# Altium schematic symbol library jlcpcb_2025_04_inductors_extended_0805.schlib: 882 symbols (part 3 of 5) (continued)
## LQW2BAN27NG00L
designator L?  Inductance: 27nH
Inductor, 27nH, ±2%, 70mΩ, 2A, SMD 0805; Manufacturer: Murata Electronics; Manufacturer Part Number: LQW2BAN27NG00L; Self-Resonant Frequency: 2.75GHz; Q Factor: 85@500MHz; Package Size: 0805; JLCPCB Basic Part: No; JLCPCB Part Number: C1329793; Supplier 1: LCSC; Category: Inductors; Supplier Part Number 1: C1329793; Tolerance: ±2%; Rated Current: 2A; DC Resistance: 70mΩ; RoHS: Yes; ComponentLink1Description: Datasheet; ComponentLink1URL: https://wmsc.lcsc.com/wmsc/upload/file/pdf/v2/lcsc/2304140030_Murata-Electronics-LQW2BAN27NG00L_C1329793.pdf; ComponentLink2Description: JLCPCB Part URL; ComponentLink2URL: https://jlcpcb.com/partdetail/C1329793; ComponentLink3Description: LCSC Part URL; ComponentLink3URL: https://lcsc.com/product-detail/Inductors-SMD_Murata-Electronics-Murata-Electronics-LQW2BAN27NG00L_C1329793.html
footprint IND-0805 (0805 (2012M) Inductor)
pins: 1, 2

## LQW2BAN27NJ00L
designator L?  Inductance: 27nH
Inductor, 27nH, ±5%, 70mΩ, SMD 0805; Manufacturer: Murata Electronics; Manufacturer Part Number: LQW2BAN27NJ00L; Self-Resonant Frequency: 2.75GHz; Q Factor: 85@500MHz; Package Size: 0805; JLCPCB Basic Part: No; JLCPCB Part Number: C1330812; Supplier 1: LCSC; Category: Inductors; Supplier Part Number 1: C1330812; Tolerance: ±5%; DC Resistance: 70mΩ; RoHS: Yes; ComponentLink1Description: Datasheet; ComponentLink1URL: https://wmsc.lcsc.com/wmsc/upload/file/pdf/v2/lcsc/2304140030_Murata-Electronics-LQW2BAN27NJ00L_C1330812.pdf; ComponentLink2Description: JLCPCB Part URL; ComponentLink2URL: https://jlcpcb.com/partdetail/C1330812; ComponentLink3Description: LCSC Part URL; ComponentLink3URL: https://lcsc.com/product-detail/Inductors-SMD_Murata-Electronics-Murata-Electronics-LQW2BAN27NJ00L_C1330812.html
footprint IND-0805 (0805 (2012M) Inductor)
pins: 1, 2

## LQW2BAN33NG00L
designator L?  Inductance: 33nH
Inductor, 33nH, ±2%, 120mΩ, 1.5A, SMD 0805; Manufacturer: Murata Electronics; Manufacturer Part Number: LQW2BAN33NG00L; Self-Resonant Frequency: 1.9GHz; Q Factor: 75@500MHz; Package Size: 0805; JLCPCB Basic Part: No; JLCPCB Part Number: C1330869; Supplier 1: LCSC; Category: Inductors; Supplier Part Number 1: C1330869; Tolerance: ±2%; Rated Current: 1.5A; DC Resistance: 120mΩ; RoHS: Yes; ComponentLink1Description: Datasheet; ComponentLink1URL: https://wmsc.lcsc.com/wmsc/upload/file/pdf/v2/lcsc/2304140030_Murata-Electronics-LQW2BAN33NG00L_C1330869.pdf; ComponentLink2Description: JLCPCB Part URL; ComponentLink2URL: https://jlcpcb.com/partdetail/C1330869; ComponentLink3Description: LCSC Part URL; ComponentLink3URL: https://lcsc.com/product-detail/Inductors-SMD_Murata-Electronics-Murata-Electronics-LQW2BAN33NG00L_C1330869.html
footprint IND-0805 (0805 (2012M) Inductor)
pins: 1, 2

## LQW2BAN47NG00L
designator L?  Inductance: 47nH
Inductor, 47nH, ±2%, 200mΩ, 1.25A, SMD 0805; Manufacturer: Murata Electronics; Manufacturer Part Number: LQW2BAN47NG00L; Package Size: 0805; JLCPCB Basic Part: No; JLCPCB Part Number: C2047552; Supplier 1: LCSC; Category: Inductors; Supplier Part Number 1: C2047552; Tolerance: ±2%; Rated Current: 1.25A; DC Resistance: 200mΩ; RoHS: Yes; ComponentLink1Description: Datasheet; ComponentLink1URL: https://wmsc.lcsc.com/wmsc/upload/file/pdf/v2/lcsc/2202010330_Murata-Electronics-LQW2BAN47NG00L_C2047552.pdf; ComponentLink2Description: JLCPCB Part URL; ComponentLink2URL: https://jlcpcb.com/partdetail/C2047552; ComponentLink3Description: LCSC Part URL; ComponentLink3URL: https://lcsc.com/product-detail/Power-Inductors_Murata-Electronics-Murata-Electronics-LQW2BAN47NG00L_C2047552.html
footprint IND-0805 (0805 (2012M) Inductor)
pins: 1, 2

## LQW2BAN75NG00L
designator L?  Inductance: 75nH
Inductor, 75nH, ±2%, 280mΩ, 1.1A, SMD 0805; Manufacturer: Murata Electronics; Manufacturer Part Number: LQW2BAN75NG00L; Package Size: 0805; JLCPCB Basic Part: No; JLCPCB Part Number: C2044773; Supplier 1: LCSC; Category: Inductors; Supplier Part Number 1: C2044773; Tolerance: ±2%; Rated Current: 1.1A; DC Resistance: 280mΩ; RoHS: Yes; ComponentLink1Description: Datasheet; ComponentLink1URL: https://wmsc.lcsc.com/wmsc/upload/file/pdf/v2/lcsc/2304140030_Murata-Electronics-LQW2BAN75NG00L_C2044773.pdf; ComponentLink2Description: JLCPCB Part URL; ComponentLink2URL: https://jlcpcb.com/partdetail/C2044773; ComponentLink3Description: LCSC Part URL; ComponentLink3URL: https://lcsc.com/product-detail/Power-Inductors_Murata-Electronics-Murata-Electronics-LQW2BAN75NG00L_C2044773.html
footprint IND-0805 (0805 (2012M) Inductor)
pins: 1, 2

## LQW2BAN91NG00L
designator L?  Inductance: 91nH
Inductor, 91nH, ±2%, 210mΩ, 1.3A, SMD 0805; Manufacturer: Murata Electronics; Manufacturer Part Number: LQW2BAN91NG00L; Package Size: 0805; JLCPCB Basic Part: No; JLCPCB Part Number: C2046328; Supplier 1: LCSC; Category: Inductors; Supplier Part Number 1: C2046328; Tolerance: ±2%; Rated Current: 1.3A; DC Resistance: 210mΩ; RoHS: Yes; ComponentLink1Description: Datasheet; ComponentLink1URL: https://wmsc.lcsc.com/wmsc/upload/file/pdf/v2/lcsc/2304140030_Murata-Electronics-LQW2BAN91NG00L_C2046328.pdf; ComponentLink2Description: JLCPCB Part URL; ComponentLink2URL: https://jlcpcb.com/partdetail/C2046328; ComponentLink3Description: LCSC Part URL; ComponentLink3URL: https://lcsc.com/product-detail/Power-Inductors_Murata-Electronics-Murata-Electronics-LQW2BAN91NG00L_C2046328.html
footprint IND-0805 (0805 (2012M) Inductor)
pins: 1, 2

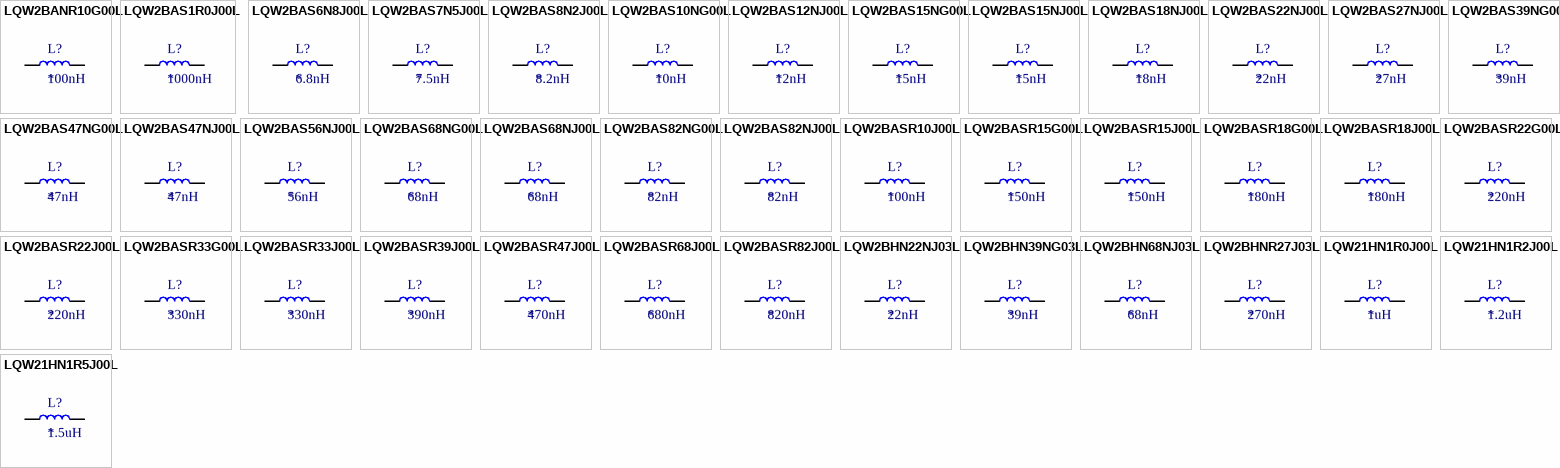
[diagram p12: symbols LQW2BANR10G00L to LQW21HN1R5J00L]

## LQW2BANR10G00L
designator L?  Inductance: 100nH
Inductor, 100nH, ±2%, 350mΩ, 1.05A, SMD 0805; Manufacturer: Murata Electronics; Manufacturer Part Number: LQW2BANR10G00L; Self-Resonant Frequency: 1.2GHz; Q Factor: 66@500MHz; Package Size: 0805; JLCPCB Basic Part: No; JLCPCB Part Number: C1330863; Supplier 1: LCSC; Category: Inductors; Supplier Part Number 1: C1330863; Tolerance: ±2%; Rated Current: 1.05A; DC Resistance: 350mΩ; RoHS: Yes; ComponentLink1Description: Datasheet; ComponentLink1URL: https://wmsc.lcsc.com/wmsc/upload/file/pdf/v2/lcsc/2304140030_Murata-Electronics-LQW2BANR10G00L_C1330863.pdf; ComponentLink2Description: JLCPCB Part URL; ComponentLink2URL: https://jlcpcb.com/partdetail/C1330863; ComponentLink3Description: LCSC Part URL; ComponentLink3URL: https://lcsc.com/product-detail/Inductors-SMD_Murata-Electronics-Murata-Electronics-LQW2BANR10G00L_C1330863.html
footprint IND-0805 (0805 (2012M) Inductor)
pins: 1, 2

## LQW2BAS1R0J00L
designator L?  Inductance: 1000nH
Inductor, 1000nH, ±5%, 2.4Ω, 170mA, SMD 0805; Manufacturer: Murata Electronics; Manufacturer Part Number: LQW2BAS1R0J00L; Self-Resonant Frequency: 200MHz; Q Factor: 23@50MHz; Package Size: 0805; JLCPCB Basic Part: No; JLCPCB Part Number: C333860; Supplier 1: LCSC; Category: Inductors; Supplier Part Number 1: C333860; Tolerance: ±5%; Rated Current: 170mA; DC Resistance: 2.4Ω; RoHS: Yes; ComponentLink1Description: Datasheet; ComponentLink1URL: https://wmsc.lcsc.com/wmsc/upload/file/pdf/v2/lcsc/2304140030_Murata-Electronics-LQW2BAS1R0J00L_C333860.pdf; ComponentLink2Description: JLCPCB Part URL; ComponentLink2URL: https://jlcpcb.com/partdetail/C333860; ComponentLink3Description: LCSC Part URL; ComponentLink3URL: https://lcsc.com/product-detail/Inductors-SMD_Murata-Electronics-Murata-Electronics-LQW2BAS1R0J00L_C333860.html
footprint IND-0805 (0805 (2012M) Inductor)
pins: 1, 2

## LQW2BAS6N8J00L
designator L?  Inductance: 6.8nH
Inductor, 6.8nH, ±5%, 110mΩ, 600mA, SMD 0805; Manufacturer: Murata Electronics; Manufacturer Part Number: LQW2BAS6N8J00L; Package Size: 0805; JLCPCB Basic Part: No; JLCPCB Part Number: C701176; Supplier 1: LCSC; Category: Inductors; Supplier Part Number 1: C701176; Tolerance: ±5%; Rated Current: 600mA; DC Resistance: 110mΩ; RoHS: Yes; ComponentLink1Description: Datasheet; ComponentLink1URL: https://wmsc.lcsc.com/wmsc/upload/file/pdf/v2/lcsc/2009241508_Murata-Electronics-LQW2BAS6N8J00L_C701176.pdf; ComponentLink2Description: JLCPCB Part URL; ComponentLink2URL: https://jlcpcb.com/partdetail/C701176; ComponentLink3Description: LCSC Part URL; ComponentLink3URL: https://lcsc.com/product-detail/Power-Inductors_Murata-Electronics-Murata-Electronics-LQW2BAS6N8J00L_C701176.html
footprint IND-0805 (0805 (2012M) Inductor)
pins: 1, 2

## LQW2BAS7N5J00L
designator L?  Inductance: 7.5nH
Inductor, 7.5nH, ±5%, 140mΩ, SMD 0805; Manufacturer: Murata Electronics; Manufacturer Part Number: LQW2BAS7N5J00L; Self-Resonant Frequency: 4.8GHz; Q Factor: 50@1000MHz; Package Size: 0805; JLCPCB Basic Part: No; JLCPCB Part Number: C162658; Supplier 1: LCSC; Category: Inductors; Supplier Part Number 1: C162658; Tolerance: ±5%; DC Resistance: 140mΩ; RoHS: Yes; ComponentLink1Description: Datasheet; ComponentLink1URL: https://wmsc.lcsc.com/wmsc/upload/file/pdf/v2/lcsc/2304140030_Murata-Electronics-LQW2BAS7N5J00L_C162658.pdf; ComponentLink2Description: JLCPCB Part URL; ComponentLink2URL: https://jlcpcb.com/partdetail/C162658; ComponentLink3Description: LCSC Part URL; ComponentLink3URL: https://lcsc.com/product-detail/Inductors-SMD_Murata-Electronics-Murata-Electronics-LQW2BAS7N5J00L_C162658.html
footprint IND-0805 (0805 (2012M) Inductor)
pins: 1, 2

## LQW2BAS8N2J00L
designator L?  Inductance: 8.2nH
Inductor, 8.2nH, ±5%, 120mΩ, SMD 0805; Manufacturer: Murata Electronics; Manufacturer Part Number: LQW2BAS8N2J00L; Self-Resonant Frequency: 4.4GHz; Q Factor: 50@1000MHz; Package Size: 0805; JLCPCB Basic Part: No; JLCPCB Part Number: C341801; Supplier 1: LCSC; Category: Inductors; Supplier Part Number 1: C341801; Tolerance: ±5%; DC Resistance: 120mΩ; RoHS: Yes; ComponentLink1Description: Datasheet; ComponentLink1URL: https://wmsc.lcsc.com/wmsc/upload/file/pdf/v2/lcsc/2304140030_Murata-Electronics-LQW2BAS8N2J00L_C341801.pdf; ComponentLink2Description: JLCPCB Part URL; ComponentLink2URL: https://jlcpcb.com/partdetail/C341801; ComponentLink3Description: LCSC Part URL; ComponentLink3URL: https://lcsc.com/product-detail/Inductors-SMD_Murata-Electronics-Murata-Electronics-LQW2BAS8N2J00L_C341801.html
footprint IND-0805 (0805 (2012M) Inductor)
pins: 1, 2

## LQW2BAS10NG00L
designator L?  Inductance: 10nH
Inductor, 10nH, ±2%, 100mΩ, 600mA, SMD 0805; Manufacturer: Murata Electronics; Manufacturer Part Number: LQW2BAS10NG00L; Self-Resonant Frequency: 4.3GHz; Q Factor: 60@500MHz; Package Size: 0805; JLCPCB Basic Part: No; JLCPCB Part Number: C341792; Supplier 1: LCSC; Category: Inductors; Supplier Part Number 1: C341792; Tolerance: ±2%; Rated Current: 600mA; DC Resistance: 100mΩ; RoHS: Yes; ComponentLink1Description: Datasheet; ComponentLink1URL: https://wmsc.lcsc.com/wmsc/upload/file/pdf/v2/lcsc/2304140030_Murata-Electronics-LQW2BAS10NG00L_C341792.pdf; ComponentLink2Description: JLCPCB Part URL; ComponentLink2URL: https://jlcpcb.com/partdetail/C341792; ComponentLink3Description: LCSC Part URL; ComponentLink3URL: https://lcsc.com/product-detail/Inductors-SMD_Murata-Electronics-Murata-Electronics-LQW2BAS10NG00L_C341792.html
footprint IND-0805 (0805 (2012M) Inductor)
pins: 1, 2

## LQW2BAS12NJ00L
designator L?  Inductance: 12nH
Inductor, 12nH, ±5%, 150mΩ, SMD 0805; Manufacturer: Murata Electronics; Manufacturer Part Number: LQW2BAS12NJ00L; Self-Resonant Frequency: 4GHz; Q Factor: 50@500MHz; Package Size: 0805; JLCPCB Basic Part: No; JLCPCB Part Number: C341793; Supplier 1: LCSC; Category: Inductors; Supplier Part Number 1: C341793; Tolerance: ±5%; DC Resistance: 150mΩ; RoHS: Yes; ComponentLink1Description: Datasheet; ComponentLink1URL: https://wmsc.lcsc.com/wmsc/upload/file/pdf/v2/lcsc/2304140030_Murata-Electronics-LQW2BAS12NJ00L_C341793.pdf; ComponentLink2Description: JLCPCB Part URL; ComponentLink2URL: https://jlcpcb.com/partdetail/C341793; ComponentLink3Description: LCSC Part URL; ComponentLink3URL: https://lcsc.com/product-detail/Inductors-SMD_Murata-Electronics-Murata-Electronics-LQW2BAS12NJ00L_C341793.html
footprint IND-0805 (0805 (2012M) Inductor)
pins: 1, 2

## LQW2BAS15NG00L
designator L?  Inductance: 15nH
Inductor, 15nH, ±2%, 170mΩ, 600mA, SMD 0805; Manufacturer: Murata Electronics; Manufacturer Part Number: LQW2BAS15NG00L; Self-Resonant Frequency: 3.2GHz; Q Factor: 50@500MHz; Package Size: 0805; JLCPCB Basic Part: No; JLCPCB Part Number: C341794; Supplier 1: LCSC; Category: Inductors; Supplier Part Number 1: C341794; Tolerance: ±2%; Rated Current: 600mA; DC Resistance: 170mΩ; RoHS: Yes; ComponentLink1Description: Datasheet; ComponentLink1URL: https://wmsc.lcsc.com/wmsc/upload/file/pdf/v2/lcsc/2304140030_Murata-Electronics-LQW2BAS15NG00L_C341794.pdf; ComponentLink2Description: JLCPCB Part URL; ComponentLink2URL: https://jlcpcb.com/partdetail/C341794; ComponentLink3Description: LCSC Part URL; ComponentLink3URL: https://lcsc.com/product-detail/Inductors-SMD_Murata-Electronics-Murata-Electronics-LQW2BAS15NG00L_C341794.html
footprint IND-0805 (0805 (2012M) Inductor)
pins: 1, 2

## LQW2BAS15NJ00L
designator L?  Inductance: 15nH
Inductor, 15nH, ±5%, 170mΩ, 600mA, SMD 0805; Manufacturer: Murata Electronics; Manufacturer Part Number: LQW2BAS15NJ00L; Package Size: 0805; JLCPCB Basic Part: No; JLCPCB Part Number: C440247; Supplier 1: LCSC; Category: Inductors; Supplier Part Number 1: C440247; Tolerance: ±5%; Rated Current: 600mA; DC Resistance: 170mΩ; RoHS: Yes; ComponentLink1Description: Datasheet; ComponentLink1URL: https://wmsc.lcsc.com/wmsc/upload/file/pdf/v2/lcsc/2304140030_Murata-Electronics-LQW2BAS15NJ00L_C440247.pdf; ComponentLink2Description: JLCPCB Part URL; ComponentLink2URL: https://jlcpcb.com/partdetail/C440247; ComponentLink3Description: LCSC Part URL; ComponentLink3URL: https://lcsc.com/product-detail/Power-Inductors_Murata-Electronics-Murata-Electronics-LQW2BAS15NJ00L_C440247.html
footprint IND-0805 (0805 (2012M) Inductor)
pins: 1, 2

## LQW2BAS18NJ00L
designator L?  Inductance: 18nH
Inductor, 18nH, ±5%, 200mΩ, SMD 0805; Manufacturer: Murata Electronics; Manufacturer Part Number: LQW2BAS18NJ00L; Self-Resonant Frequency: 3.1GHz; Q Factor: 50@500MHz; Package Size: 0805; JLCPCB Basic Part: No; JLCPCB Part Number: C341795; Supplier 1: LCSC; Category: Inductors; Supplier Part Number 1: C341795; Tolerance: ±5%; DC Resistance: 200mΩ; RoHS: Yes; ComponentLink1Description: Datasheet; ComponentLink1URL: https://wmsc.lcsc.com/wmsc/upload/file/pdf/v2/lcsc/2304140030_Murata-Electronics-LQW2BAS18NJ00L_C341795.pdf; ComponentLink2Description: JLCPCB Part URL; ComponentLink2URL: https://jlcpcb.com/partdetail/C341795; ComponentLink3Description: LCSC Part URL; ComponentLink3URL: https://lcsc.com/product-detail/Inductors-SMD_Murata-Electronics-Murata-Electronics-LQW2BAS18NJ00L_C341795.html
footprint IND-0805 (0805 (2012M) Inductor)
pins: 1, 2

## LQW2BAS22NJ00L
designator L?  Inductance: 22nH
Inductor, 22nH, ±5%, 220mΩ, 500mA, SMD 0805; Manufacturer: Murata Electronics; Manufacturer Part Number: LQW2BAS22NJ00L; Package Size: 0805; JLCPCB Basic Part: No; JLCPCB Part Number: C668481; Supplier 1: LCSC; Category: Inductors; Supplier Part Number 1: C668481; Tolerance: ±5%; Rated Current: 500mA; DC Resistance: 220mΩ; RoHS: Yes; ComponentLink1Description: Datasheet; ComponentLink1URL: https://wmsc.lcsc.com/wmsc/upload/file/pdf/v2/lcsc/2009241508_Murata-Electronics-LQW2BAS22NJ00L_C668481.pdf; ComponentLink2Description: JLCPCB Part URL; ComponentLink2URL: https://jlcpcb.com/partdetail/C668481; ComponentLink3Description: LCSC Part URL; ComponentLink3URL: https://lcsc.com/product-detail/Power-Inductors_Murata-Electronics-Murata-Electronics-LQW2BAS22NJ00L_C668481.html
footprint IND-0805 (0805 (2012M) Inductor)
pins: 1, 2

## LQW2BAS27NJ00L
designator L?  Inductance: 27nH
Inductor, 27nH, ±5%, 250mΩ, 500mA, SMD 0805; Manufacturer: Murata Electronics; Manufacturer Part Number: LQW2BAS27NJ00L; Self-Resonant Frequency: 2.58GHz; Q Factor: 55@500MHz; Package Size: 0805; JLCPCB Basic Part: No; JLCPCB Part Number: C162656; Supplier 1: LCSC; Category: Inductors; Supplier Part Number 1: C162656; Tolerance: ±5%; Rated Current: 500mA; DC Resistance: 250mΩ; RoHS: Yes; ComponentLink1Description: Datasheet; ComponentLink1URL: https://wmsc.lcsc.com/wmsc/upload/file/pdf/v2/lcsc/2304140030_Murata-Electronics-LQW2BAS27NJ00L_C162656.pdf; ComponentLink2Description: JLCPCB Part URL; ComponentLink2URL: https://jlcpcb.com/partdetail/C162656; ComponentLink3Description: LCSC Part URL; ComponentLink3URL: https://lcsc.com/product-detail/Inductors-SMD_Murata-Electronics-Murata-Electronics-LQW2BAS27NJ00L_C162656.html
footprint IND-0805 (0805 (2012M) Inductor)
pins: 1, 2

## LQW2BAS39NG00L
designator L?  Inductance: 39nH
Inductor, 39nH, ±2%, 290mΩ, 500mA, SMD 0805; Manufacturer: Murata Electronics; Manufacturer Part Number: LQW2BAS39NG00L; Self-Resonant Frequency: 2GHz; Q Factor: 60@500MHz; Package Size: 0805; JLCPCB Basic Part: No; JLCPCB Part Number: C341797; Supplier 1: LCSC; Category: Inductors; Supplier Part Number 1: C341797; Tolerance: ±2%; Rated Current: 500mA; DC Resistance: 290mΩ; RoHS: Yes; ComponentLink1Description: Datasheet; ComponentLink1URL: https://wmsc.lcsc.com/wmsc/upload/file/pdf/v2/lcsc/2304140030_Murata-Electronics-LQW2BAS39NG00L_C341797.pdf; ComponentLink2Description: JLCPCB Part URL; ComponentLink2URL: https://jlcpcb.com/partdetail/C341797; ComponentLink3Description: LCSC Part URL; ComponentLink3URL: https://lcsc.com/product-detail/Inductors-SMD_Murata-Electronics-Murata-Electronics-LQW2BAS39NG00L_C341797.html
footprint IND-0805 (0805 (2012M) Inductor)
pins: 1, 2

## LQW2BAS47NG00L
designator L?  Inductance: 47nH
Inductor, 47nH, ±2%, 310mΩ, 500mA, SMD 0805; Manufacturer: Murata Electronics; Manufacturer Part Number: LQW2BAS47NG00L; Self-Resonant Frequency: 1.7GHz; Q Factor: 60@500MHz; Package Size: 0805; JLCPCB Basic Part: No; JLCPCB Part Number: C162657; Supplier 1: LCSC; Category: Inductors; Supplier Part Number 1: C162657; Tolerance: ±2%; Rated Current: 500mA; DC Resistance: 310mΩ; RoHS: Yes; ComponentLink1Description: Datasheet; ComponentLink1URL: https://wmsc.lcsc.com/wmsc/upload/file/pdf/v2/lcsc/2304140030_Murata-Electronics-LQW2BAS47NG00L_C162657.pdf; ComponentLink2Description: JLCPCB Part URL; ComponentLink2URL: https://jlcpcb.com/partdetail/C162657; ComponentLink3Description: LCSC Part URL; ComponentLink3URL: https://lcsc.com/product-detail/Inductors-SMD_Murata-Electronics-Murata-Electronics-LQW2BAS47NG00L_C162657.html
footprint IND-0805 (0805 (2012M) Inductor)
pins: 1, 2

## LQW2BAS47NJ00L
designator L?  Inductance: 47nH
Inductor, 47nH, ±5%, 310mΩ, 500mA, SMD 0805; Manufacturer: Murata Electronics; Manufacturer Part Number: LQW2BAS47NJ00L; Package Size: 0805; JLCPCB Basic Part: No; JLCPCB Part Number: C440248; Supplier 1: LCSC; Category: Inductors; Supplier Part Number 1: C440248; Tolerance: ±5%; Rated Current: 500mA; DC Resistance: 310mΩ; RoHS: Yes; ComponentLink1Description: Datasheet; ComponentLink1URL: https://wmsc.lcsc.com/wmsc/upload/file/pdf/v2/lcsc/2304140030_Murata-Electronics-LQW2BAS47NJ00L_C440248.pdf; ComponentLink2Description: JLCPCB Part URL; ComponentLink2URL: https://jlcpcb.com/partdetail/C440248; ComponentLink3Description: LCSC Part URL; ComponentLink3URL: https://lcsc.com/product-detail/Power-Inductors_Murata-Electronics-Murata-Electronics-LQW2BAS47NJ00L_C440248.html
footprint IND-0805 (0805 (2012M) Inductor)
pins: 1, 2

## LQW2BAS56NJ00L
designator L?  Inductance: 56nH
Inductor, 56nH, ±5%, 340mΩ, 500mA, SMD 0805; Manufacturer: Murata Electronics; Manufacturer Part Number: LQW2BAS56NJ00L; Self-Resonant Frequency: 1.6GHz; Q Factor: 60@500MHz; Package Size: 0805; JLCPCB Basic Part: No; JLCPCB Part Number: C341799; Supplier 1: LCSC; Category: Inductors; Supplier Part Number 1: C341799; Tolerance: ±5%; Rated Current: 500mA; DC Resistance: 340mΩ; RoHS: Yes; ComponentLink1Description: Datasheet; ComponentLink1URL: https://wmsc.lcsc.com/wmsc/upload/file/pdf/v2/lcsc/2304140030_Murata-Electronics-LQW2BAS56NJ00L_C341799.pdf; ComponentLink2Description: JLCPCB Part URL; ComponentLink2URL: https://jlcpcb.com/partdetail/C341799; ComponentLink3Description: LCSC Part URL; ComponentLink3URL: https://lcsc.com/product-detail/Inductors-SMD_Murata-Electronics-Murata-Electronics-LQW2BAS56NJ00L_C341799.html
footprint IND-0805 (0805 (2012M) Inductor)
pins: 1, 2

## LQW2BAS68NG00L
designator L?  Inductance: 68nH
Inductor, 68nH, ±2%, 380mΩ, 500mA, SMD 0805; Manufacturer: Murata Electronics; Manufacturer Part Number: LQW2BAS68NG00L; Package Size: 0805; JLCPCB Basic Part: No; JLCPCB Part Number: C2044183; Supplier 1: LCSC; Category: Inductors; Supplier Part Number 1: C2044183; Tolerance: ±2%; Rated Current: 500mA; DC Resistance: 380mΩ; RoHS: Yes; ComponentLink1Description: Datasheet; ComponentLink1URL: https://wmsc.lcsc.com/wmsc/upload/file/pdf/v2/lcsc/2202010130_Murata-Electronics-LQW2BAS68NG00L_C2044183.pdf; ComponentLink2Description: JLCPCB Part URL; ComponentLink2URL: https://jlcpcb.com/partdetail/C2044183; ComponentLink3Description: LCSC Part URL; ComponentLink3URL: https://lcsc.com/product-detail/Power-Inductors_Murata-Electronics-Murata-Electronics-LQW2BAS68NG00L_C2044183.html
footprint IND-0805 (0805 (2012M) Inductor)
pins: 1, 2

## LQW2BAS68NJ00L
designator L?  Inductance: 68nH
Inductor, 68nH, ±5%, 380mΩ, 500mA, SMD 0805; Manufacturer: Murata Electronics; Manufacturer Part Number: LQW2BAS68NJ00L; Self-Resonant Frequency: 1.5GHz; Q Factor: 60@500MHz; Package Size: 0805; JLCPCB Basic Part: No; JLCPCB Part Number: C341800; Supplier 1: LCSC; Category: Inductors; Supplier Part Number 1: C341800; Tolerance: ±5%; Rated Current: 500mA; DC Resistance: 380mΩ; RoHS: Yes; ComponentLink1Description: Datasheet; ComponentLink1URL: https://wmsc.lcsc.com/wmsc/upload/file/pdf/v2/lcsc/2304140030_Murata-Electronics-LQW2BAS68NJ00L_C341800.pdf; ComponentLink2Description: JLCPCB Part URL; ComponentLink2URL: https://jlcpcb.com/partdetail/C341800; ComponentLink3Description: LCSC Part URL; ComponentLink3URL: https://lcsc.com/product-detail/Inductors-SMD_Murata-Electronics-Murata-Electronics-LQW2BAS68NJ00L_C341800.html
footprint IND-0805 (0805 (2012M) Inductor)
pins: 1, 2

## LQW2BAS82NG00L
designator L?  Inductance: 82nH
Inductor, 82nH, ±2%, 420mΩ, 400mA, SMD 0805; Manufacturer: Murata Electronics; Manufacturer Part Number: LQW2BAS82NG00L; Package Size: 0805; JLCPCB Basic Part: No; JLCPCB Part Number: C703723; Supplier 1: LCSC; Category: Inductors; Supplier Part Number 1: C703723; Tolerance: ±2%; Rated Current: 400mA; DC Resistance: 420mΩ; RoHS: Yes; ComponentLink1Description: Datasheet; ComponentLink1URL: https://wmsc.lcsc.com/wmsc/upload/file/pdf/v2/lcsc/2212191030_Murata-Electronics-LQW2BAS82NG00L_C703723.pdf; ComponentLink2Description: JLCPCB Part URL; ComponentLink2URL: https://jlcpcb.com/partdetail/C703723; ComponentLink3Description: LCSC Part URL; ComponentLink3URL: https://lcsc.com/product-detail/Power-Inductors_Murata-Electronics-Murata-Electronics-LQW2BAS82NG00L_C703723.html
footprint IND-0805 (0805 (2012M) Inductor)
pins: 1, 2

## LQW2BAS82NJ00L
designator L?  Inductance: 82nH
Inductor, 82nH, ±5%, 420mΩ, 400mA, SMD 0805; Manufacturer: Murata Electronics; Manufacturer Part Number: LQW2BAS82NJ00L; Self-Resonant Frequency: 1.33GHz; Q Factor: 65@500MHz; Package Size: 0805; JLCPCB Basic Part: No; JLCPCB Part Number: C162659; Supplier 1: LCSC; Category: Inductors; Supplier Part Number 1: C162659; Tolerance: ±5%; Rated Current: 400mA; DC Resistance: 420mΩ; RoHS: Yes; ComponentLink1Description: Datasheet; ComponentLink1URL: https://wmsc.lcsc.com/wmsc/upload/file/pdf/v2/lcsc/2304140030_Murata-Electronics-LQW2BAS82NJ00L_C162659.pdf; ComponentLink2Description: JLCPCB Part URL; ComponentLink2URL: https://jlcpcb.com/partdetail/C162659; ComponentLink3Description: LCSC Part URL; ComponentLink3URL: https://lcsc.com/product-detail/Inductors-SMD_Murata-Electronics-Murata-Electronics-LQW2BAS82NJ00L_C162659.html
footprint IND-0805 (0805 (2012M) Inductor)
pins: 1, 2

## LQW2BASR10J00L
designator L?  Inductance: 100nH
Inductor, 100nH, ±5%, 460mΩ, SMD 0805; Manufacturer: Murata Electronics; Manufacturer Part Number: LQW2BASR10J00L; Self-Resonant Frequency: 1.25GHz; Q Factor: 65@500MHz; Package Size: 0805; JLCPCB Basic Part: No; JLCPCB Part Number: C341802; Supplier 1: LCSC; Category: Inductors; Supplier Part Number 1: C341802; Tolerance: ±5%; DC Resistance: 460mΩ; RoHS: Yes; ComponentLink1Description: Datasheet; ComponentLink1URL: https://wmsc.lcsc.com/wmsc/upload/file/pdf/v2/lcsc/2304140030_Murata-Electronics-LQW2BASR10J00L_C341802.pdf; ComponentLink2Description: JLCPCB Part URL; ComponentLink2URL: https://jlcpcb.com/partdetail/C341802; ComponentLink3Description: LCSC Part URL; ComponentLink3URL: https://lcsc.com/product-detail/Inductors-SMD_Murata-Electronics-Murata-Electronics-LQW2BASR10J00L_C341802.html
footprint IND-0805 (0805 (2012M) Inductor)
pins: 1, 2

## LQW2BASR15G00L
designator L?  Inductance: 150nH
Inductor, 150nH, ±2%, 560mΩ, 400mA, SMD 0805; Manufacturer: Murata Electronics; Manufacturer Part Number: LQW2BASR15G00L; Package Size: 0805; JLCPCB Basic Part: No; JLCPCB Part Number: C703721; Supplier 1: LCSC; Category: Inductors; Supplier Part Number 1: C703721; Tolerance: ±2%; Rated Current: 400mA; DC Resistance: 560mΩ; RoHS: Yes; ComponentLink1Description: Datasheet; ComponentLink1URL: https://wmsc.lcsc.com/wmsc/upload/file/pdf/v2/lcsc/2105241334_Murata-Electronics-LQW2BASR15G00L_C703721.pdf; ComponentLink2Description: JLCPCB Part URL; ComponentLink2URL: https://jlcpcb.com/partdetail/C703721; ComponentLink3Description: LCSC Part URL; ComponentLink3URL: https://lcsc.com/product-detail/Power-Inductors_Murata-Electronics-Murata-Electronics-LQW2BASR15G00L_C703721.html
footprint IND-0805 (0805 (2012M) Inductor)
pins: 1, 2

## LQW2BASR15J00L
designator L?  Inductance: 150nH
Inductor, 150nH, ±5%, 560mΩ, SMD 0805; Manufacturer: Murata Electronics; Manufacturer Part Number: LQW2BASR15J00L; Self-Resonant Frequency: 920MHz; Q Factor: 50@250MHz; Package Size: 0805; JLCPCB Basic Part: No; JLCPCB Part Number: C341803; Supplier 1: LCSC; Category: Inductors; Supplier Part Number 1: C341803; Tolerance: ±5%; DC Resistance: 560mΩ; RoHS: Yes; ComponentLink1Description: Datasheet; ComponentLink1URL: https://wmsc.lcsc.com/wmsc/upload/file/pdf/v2/lcsc/2304140030_Murata-Electronics-LQW2BASR15J00L_C341803.pdf; ComponentLink2Description: JLCPCB Part URL; ComponentLink2URL: https://jlcpcb.com/partdetail/C341803; ComponentLink3Description: LCSC Part URL; ComponentLink3URL: https://lcsc.com/product-detail/Inductors-SMD_Murata-Electronics-Murata-Electronics-LQW2BASR15J00L_C341803.html
footprint IND-0805 (0805 (2012M) Inductor)
pins: 1, 2

## LQW2BASR18G00L
designator L?  Inductance: 180nH
Inductor, 180nH, ±2%, 640mΩ, 400mA, SMD 0805; Manufacturer: Murata Electronics; Manufacturer Part Number: LQW2BASR18G00L; Package Size: 0805; JLCPCB Basic Part: No; JLCPCB Part Number: C703720; Supplier 1: LCSC; Category: Inductors; Supplier Part Number 1: C703720; Tolerance: ±2%; Rated Current: 400mA; DC Resistance: 640mΩ; RoHS: Yes; ComponentLink1Description: Datasheet; ComponentLink1URL: https://wmsc.lcsc.com/wmsc/upload/file/pdf/v2/lcsc/2304140030_Murata-Electronics-LQW2BASR18G00L_C703720.pdf; ComponentLink2Description: JLCPCB Part URL; ComponentLink2URL: https://jlcpcb.com/partdetail/C703720; ComponentLink3Description: LCSC Part URL; ComponentLink3URL: https://lcsc.com/product-detail/Power-Inductors_Murata-Electronics-Murata-Electronics-LQW2BASR18G00L_C703720.html
footprint IND-0805 (0805 (2012M) Inductor)
pins: 1, 2

## LQW2BASR18J00L
designator L?  Inductance: 180nH
Inductor, 180nH, ±5%, 640mΩ, SMD 0805; Manufacturer: Murata Electronics; Manufacturer Part Number: LQW2BASR18J00L; Self-Resonant Frequency: 920MHz; Q Factor: 50@250MHz; Package Size: 0805; JLCPCB Basic Part: No; JLCPCB Part Number: C162660; Supplier 1: LCSC; Category: Inductors; Supplier Part Number 1: C162660; Tolerance: ±5%; DC Resistance: 640mΩ; RoHS: Yes; ComponentLink1Description: Datasheet; ComponentLink1URL: https://wmsc.lcsc.com/wmsc/upload/file/pdf/v2/lcsc/2304140030_Murata-Electronics-LQW2BASR18J00L_C162660.pdf; ComponentLink2Description: JLCPCB Part URL; ComponentLink2URL: https://jlcpcb.com/partdetail/C162660; ComponentLink3Description: LCSC Part URL; ComponentLink3URL: https://lcsc.com/product-detail/Inductors-SMD_Murata-Electronics-Murata-Electronics-LQW2BASR18J00L_C162660.html
footprint IND-0805 (0805 (2012M) Inductor)
pins: 1, 2

## LQW2BASR22G00L
designator L?  Inductance: 220nH
Inductor, 220nH, ±2%, 700mΩ, 400mA, SMD 0805; Manufacturer: Murata Electronics; Manufacturer Part Number: LQW2BASR22G00L; Package Size: 0805; JLCPCB Basic Part: No; JLCPCB Part Number: C527968; Supplier 1: LCSC; Category: Inductors; Supplier Part Number 1: C527968; Tolerance: ±2%; Rated Current: 400mA; DC Resistance: 700mΩ; RoHS: Yes; ComponentLink1Description: Datasheet; ComponentLink1URL: https://wmsc.lcsc.com/wmsc/upload/file/pdf/v2/lcsc/2304140030_Murata-Electronics-LQW2BASR22G00L_C527968.pdf; ComponentLink2Description: JLCPCB Part URL; ComponentLink2URL: https://jlcpcb.com/partdetail/C527968; ComponentLink3Description: LCSC Part URL; ComponentLink3URL: https://lcsc.com/product-detail/Power-Inductors_Murata-Electronics-Murata-Electronics-LQW2BASR22G00L_C527968.html
footprint IND-0805 (0805 (2012M) Inductor)
pins: 1, 2

## LQW2BASR22J00L
designator L?  Inductance: 220nH
Inductor, 220nH, ±5%, 700mΩ, 400mA, SMD 0805; Manufacturer: Murata Electronics; Manufacturer Part Number: LQW2BASR22J00L; Self-Resonant Frequency: 820MHz; Q Factor: 50@250MHz; Package Size: 0805; JLCPCB Basic Part: No; JLCPCB Part Number: C337958; Supplier 1: LCSC; Category: Inductors; Supplier Part Number 1: C337958; Tolerance: ±5%; Rated Current: 400mA; DC Resistance: 700mΩ; RoHS: Yes; ComponentLink1Description: Datasheet; ComponentLink1URL: https://wmsc.lcsc.com/wmsc/upload/file/pdf/v2/lcsc/2304140030_Murata-Electronics-LQW2BASR22J00L_C337958.pdf; ComponentLink2Description: JLCPCB Part URL; ComponentLink2URL: https://jlcpcb.com/partdetail/C337958; ComponentLink3Description: LCSC Part URL; ComponentLink3URL: https://lcsc.com/product-detail/Inductors-SMD_Murata-Electronics-Murata-Electronics-LQW2BASR22J00L_C337958.html
footprint IND-0805 (0805 (2012M) Inductor)
pins: 1, 2

## LQW2BASR33G00L
designator L?  Inductance: 330nH
Inductor, 330nH, ±2%, 1.4Ω, 310mA, SMD 0805; Manufacturer: Murata Electronics; Manufacturer Part Number: LQW2BASR33G00L; Package Size: 0805; JLCPCB Basic Part: No; JLCPCB Part Number: C703717; Supplier 1: LCSC; Category: Inductors; Supplier Part Number 1: C703717; Tolerance: ±2%; Rated Current: 310mA; DC Resistance: 1.4Ω; RoHS: Yes; ComponentLink1Description: Datasheet; ComponentLink1URL: https://wmsc.lcsc.com/wmsc/upload/file/pdf/v2/lcsc/2108140130_Murata-Electronics-LQW2BASR33G00L_C703717.pdf; ComponentLink2Description: JLCPCB Part URL; ComponentLink2URL: https://jlcpcb.com/partdetail/C703717; ComponentLink3Description: LCSC Part URL; ComponentLink3URL: https://lcsc.com/product-detail/Power-Inductors_Murata-Electronics-Murata-Electronics-LQW2BASR33G00L_C703717.html
footprint IND-0805 (0805 (2012M) Inductor)
pins: 1, 2

## LQW2BASR33J00L
designator L?  Inductance: 330nH
Inductor, 330nH, ±5%, 1.4Ω, 310mA, SMD 0805; Manufacturer: Murata Electronics; Manufacturer Part Number: LQW2BASR33J00L; Self-Resonant Frequency: 650MHz; Q Factor: 48@250MHz; Package Size: 0805; JLCPCB Basic Part: No; JLCPCB Part Number: C184530; Supplier 1: LCSC; Category: Inductors; Supplier Part Number 1: C184530; Tolerance: ±5%; Rated Current: 310mA; DC Resistance: 1.4Ω; RoHS: Yes; ComponentLink1Description: Datasheet; ComponentLink1URL: https://wmsc.lcsc.com/wmsc/upload/file/pdf/v2/lcsc/2304140030_Murata-Electronics-LQW2BASR33J00L_C184530.pdf; ComponentLink2Description: JLCPCB Part URL; ComponentLink2URL: https://jlcpcb.com/partdetail/C184530; ComponentLink3Description: LCSC Part URL; ComponentLink3URL: https://lcsc.com/product-detail/Inductors-SMD_Murata-Electronics-Murata-Electronics-LQW2BASR33J00L_C184530.html
footprint IND-0805 (0805 (2012M) Inductor)
pins: 1, 2

## LQW2BASR39J00L
designator L?  Inductance: 390nH
Inductor, 390nH, ±5%, 1.5Ω, 290mA, SMD 0805; Manufacturer: Murata Electronics; Manufacturer Part Number: LQW2BASR39J00L; Package Size: 0805; JLCPCB Basic Part: No; JLCPCB Part Number: C527970; Supplier 1: LCSC; Category: Inductors; Supplier Part Number 1: C527970; Tolerance: ±5%; Rated Current: 290mA; DC Resistance: 1.5Ω; RoHS: Yes; ComponentLink1Description: Datasheet; ComponentLink1URL: https://wmsc.lcsc.com/wmsc/upload/file/pdf/v2/lcsc/2304140030_Murata-Electronics-LQW2BASR39J00L_C527970.pdf; ComponentLink2Description: JLCPCB Part URL; ComponentLink2URL: https://jlcpcb.com/partdetail/C527970; ComponentLink3Description: LCSC Part URL; ComponentLink3URL: https://lcsc.com/product-detail/Power-Inductors_Murata-Electronics-Murata-Electronics-LQW2BASR39J00L_C527970.html
footprint IND-0805 (0805 (2012M) Inductor)
pins: 1, 2

## LQW2BASR47J00L
designator L?  Inductance: 470nH
Inductor, 470nH, ±5%, 1.76Ω, 250mA, SMD 0805; Manufacturer: Murata Electronics; Manufacturer Part Number: LQW2BASR47J00L; Self-Resonant Frequency: 300MHz; Q Factor: 33@100MHz; Package Size: 0805; JLCPCB Basic Part: No; JLCPCB Part Number: C337959; Supplier 1: LCSC; Category: Inductors; Supplier Part Number 1: C337959; Tolerance: ±5%; Rated Current: 250mA; DC Resistance: 1.76Ω; RoHS: Yes; ComponentLink1Description: Datasheet; ComponentLink1URL: https://wmsc.lcsc.com/wmsc/upload/file/pdf/v2/lcsc/2304140030_Murata-Electronics-LQW2BASR47J00L_C337959.pdf; ComponentLink2Description: JLCPCB Part URL; ComponentLink2URL: https://jlcpcb.com/partdetail/C337959; ComponentLink3Description: LCSC Part URL; ComponentLink3URL: https://lcsc.com/product-detail/Inductors-SMD_Murata-Electronics-Murata-Electronics-LQW2BASR47J00L_C337959.html
footprint IND-0805 (0805 (2012M) Inductor)
pins: 1, 2

## LQW2BASR68J00L
designator L?  Inductance: 680nH
Inductor, 680nH, ±5%, 2.2Ω, 190mA, SMD 0805; Manufacturer: Murata Electronics; Manufacturer Part Number: LQW2BASR68J00L; Package Size: 0805; JLCPCB Basic Part: No; JLCPCB Part Number: C701173; Supplier 1: LCSC; Category: Inductors; Supplier Part Number 1: C701173; Tolerance: ±5%; Rated Current: 190mA; DC Resistance: 2.2Ω; RoHS: Yes; ComponentLink1Description: Datasheet; ComponentLink1URL: https://wmsc.lcsc.com/wmsc/upload/file/pdf/v2/lcsc/2012071939_Murata-Electronics-LQW2BASR68J00L_C701173.pdf; ComponentLink2Description: JLCPCB Part URL; ComponentLink2URL: https://jlcpcb.com/partdetail/C701173; ComponentLink3Description: LCSC Part URL; ComponentLink3URL: https://lcsc.com/product-detail/Power-Inductors_Murata-Electronics-Murata-Electronics-LQW2BASR68J00L_C701173.html
footprint IND-0805 (0805 (2012M) Inductor)
pins: 1, 2

## LQW2BASR82J00L
designator L?  Inductance: 820nH
Inductor, 820nH, ±5%, 2.35Ω, SMD 0805; Manufacturer: Murata Electronics; Manufacturer Part Number: LQW2BASR82J00L; Self-Resonant Frequency: 230MHz; Q Factor: 23@50MHz; Package Size: 0805; JLCPCB Basic Part: No; JLCPCB Part Number: C162662; Supplier 1: LCSC; Category: Inductors; Supplier Part Number 1: C162662; Tolerance: ±5%; DC Resistance: 2.35Ω; RoHS: Yes; ComponentLink1Description: Datasheet; ComponentLink1URL: https://wmsc.lcsc.com/wmsc/upload/file/pdf/v2/lcsc/2304140030_Murata-Electronics-LQW2BASR82J00L_C162662.pdf; ComponentLink2Description: JLCPCB Part URL; ComponentLink2URL: https://jlcpcb.com/partdetail/C162662; ComponentLink3Description: LCSC Part URL; ComponentLink3URL: https://lcsc.com/product-detail/Inductors-SMD_Murata-Electronics-Murata-Electronics-LQW2BASR82J00L_C162662.html
footprint IND-0805 (0805 (2012M) Inductor)
pins: 1, 2

## LQW2BHN22NJ03L
designator L?  Inductance: 22nH
Inductor, 22nH, ±5%, 90mΩ, 720mA, SMD 0805; Manufacturer: Murata Electronics; Manufacturer Part Number: LQW2BHN22NJ03L; Self-Resonant Frequency: 2.1GHz; Q Factor: 30@250MHz; Package Size: 0805; JLCPCB Basic Part: No; JLCPCB Part Number: C113133; Supplier 1: LCSC; Category: Inductors; Supplier Part Number 1: C113133; Tolerance: ±5%; Rated Current: 720mA; DC Resistance: 90mΩ; RoHS: Yes; ComponentLink1Description: Datasheet; ComponentLink1URL: https://wmsc.lcsc.com/wmsc/upload/file/pdf/v2/lcsc/2304140030_Murata-Electronics-LQW2BHN22NJ03L_C113133.pdf; ComponentLink2Description: JLCPCB Part URL; ComponentLink2URL: https://jlcpcb.com/partdetail/C113133; ComponentLink3Description: LCSC Part URL; ComponentLink3URL: https://lcsc.com/product-detail/Inductors-SMD_Murata-Electronics-Murata-Electronics-LQW2BHN22NJ03L_C113133.html
footprint IND-0805 (0805 (2012M) Inductor)
pins: 1, 2

## LQW2BHN39NG03L
designator L?  Inductance: 39nH
Inductor, 39nH, ±2%, 90mΩ, 730mA, SMD 0805; Manufacturer: Murata Electronics; Manufacturer Part Number: LQW2BHN39NG03L; Package Size: 0805; JLCPCB Basic Part: No; JLCPCB Part Number: C703099; Supplier 1: LCSC; Category: Inductors; Supplier Part Number 1: C703099; Tolerance: ±2%; Rated Current: 730mA; DC Resistance: 90mΩ; RoHS: Yes; ComponentLink1Description: Datasheet; ComponentLink1URL: https://wmsc.lcsc.com/wmsc/upload/file/pdf/v2/lcsc/2304140030_Murata-Electronics-LQW2BHN39NG03L_C703099.pdf; ComponentLink2Description: JLCPCB Part URL; ComponentLink2URL: https://jlcpcb.com/partdetail/C703099; ComponentLink3Description: LCSC Part URL; ComponentLink3URL: https://lcsc.com/product-detail/Power-Inductors_Murata-Electronics-Murata-Electronics-LQW2BHN39NG03L_C703099.html
footprint IND-0805 (0805 (2012M) Inductor)
pins: 1, 2

## LQW2BHN68NJ03L
designator L?  Inductance: 68nH
Inductor, 68nH, ±5%, 230mΩ, 460mA, SMD 0805; Manufacturer: Murata Electronics; Manufacturer Part Number: LQW2BHN68NJ03L; Package Size: 0805; JLCPCB Basic Part: No; JLCPCB Part Number: C337960; Supplier 1: LCSC; Category: Inductors; Supplier Part Number 1: C337960; Tolerance: ±5%; Rated Current: 460mA; DC Resistance: 230mΩ; RoHS: Yes; ComponentLink1Description: Datasheet; ComponentLink1URL: https://wmsc.lcsc.com/wmsc/upload/file/pdf/v2/lcsc/2304140030_Murata-Electronics-LQW2BHN68NJ03L_C337960.pdf; ComponentLink2Description: JLCPCB Part URL; ComponentLink2URL: https://jlcpcb.com/partdetail/C337960; ComponentLink3Description: LCSC Part URL; ComponentLink3URL: https://lcsc.com/product-detail/Power-Inductors_Murata-Electronics-Murata-Electronics-LQW2BHN68NJ03L_C337960.html
footprint IND-0805 (0805 (2012M) Inductor)
pins: 1, 2

## LQW2BHNR27J03L
designator L?  Inductance: 270nH
Inductor, 270nH, ±5%, 2Ω, 190mA, SMD 0805; Manufacturer: Murata Electronics; Manufacturer Part Number: LQW2BHNR27J03L; Self-Resonant Frequency: 550MHz; Q Factor: 15@25.2MHz; Package Size: 0805; JLCPCB Basic Part: No; JLCPCB Part Number: C307618; Supplier 1: LCSC; Category: Inductors; Supplier Part Number 1: C307618; Tolerance: ±5%; Rated Current: 190mA; DC Resistance: 2Ω; RoHS: Yes; ComponentLink1Description: Datasheet; ComponentLink1URL: https://wmsc.lcsc.com/wmsc/upload/file/pdf/v2/lcsc/2304140030_Murata-Electronics-LQW2BHNR27J03L_C307618.pdf; ComponentLink2Description: JLCPCB Part URL; ComponentLink2URL: https://jlcpcb.com/partdetail/C307618; ComponentLink3Description: LCSC Part URL; ComponentLink3URL: https://lcsc.com/product-detail/Inductors-SMD_Murata-Electronics-Murata-Electronics-LQW2BHNR27J03L_C307618.html
footprint IND-0805 (0805 (2012M) Inductor)
pins: 1, 2

## LQW21HN1R0J00L
designator L?  Inductance: 1uH
Inductor, 1uH, ±5%, 2.86Ω, 115mA, SMD 0805; Manufacturer: Murata Electronics; Manufacturer Part Number: LQW21HN1R0J00L; Self-Resonant Frequency: 10MHz; Q Factor: 35@100MHz; Package Size: 0805; JLCPCB Basic Part: No; JLCPCB Part Number: C91631; Supplier 1: LCSC; Category: Inductors; Supplier Part Number 1: C91631; Tolerance: ±5%; Rated Current: 115mA; DC Resistance: 2.86Ω; RoHS: Yes; ComponentLink1Description: Datasheet; ComponentLink1URL: https://wmsc.lcsc.com/wmsc/upload/file/pdf/v2/lcsc/1810201242_Murata-Electronics-LQW21HN1R0J00L_C91631.pdf; ComponentLink2Description: JLCPCB Part URL; ComponentLink2URL: https://jlcpcb.com/partdetail/C91631; ComponentLink3Description: LCSC Part URL; ComponentLink3URL: https://lcsc.com/product-detail/Inductors-SMD_Murata-Electronics-Murata-Electronics-LQW21HN1R0J00L_C91631.html
footprint IND-0805 (0805 (2012M) Inductor)
pins: 1, 2

## LQW21HN1R2J00L
designator L?  Inductance: 1.2uH
Inductor, 1.2uH, ±5%, 3.12Ω, 100mA, SMD 0805; Manufacturer: Murata Electronics; Manufacturer Part Number: LQW21HN1R2J00L; Package Size: 0805; JLCPCB Basic Part: No; JLCPCB Part Number: C703729; Supplier 1: LCSC; Category: Inductors; Supplier Part Number 1: C703729; Tolerance: ±5%; Rated Current: 100mA; DC Resistance: 3.12Ω; RoHS: Yes; ComponentLink1Description: Datasheet; ComponentLink1URL: https://wmsc.lcsc.com/wmsc/upload/file/pdf/v2/lcsc/2304140030_Murata-Electronics-LQW21HN1R2J00L_C703729.pdf; ComponentLink2Description: JLCPCB Part URL; ComponentLink2URL: https://jlcpcb.com/partdetail/C703729; ComponentLink3Description: LCSC Part URL; ComponentLink3URL: https://lcsc.com/product-detail/Power-Inductors_Murata-Electronics-Murata-Electronics-LQW21HN1R2J00L_C703729.html
footprint IND-0805 (0805 (2012M) Inductor)
pins: 1, 2

## LQW21HN1R5J00L
designator L?  Inductance: 1.5uH
Inductor, 1.5uH, ±5%, 5.33Ω, 85mA, SMD 0805; Manufacturer: Murata Electronics; Manufacturer Part Number: LQW21HN1R5J00L; Self-Resonant Frequency: 10MHz; Q Factor: 35@100MHz; Package Size: 0805; JLCPCB Basic Part: No; JLCPCB Part Number: C237281; Supplier 1: LCSC; Category: Inductors; Supplier Part Number 1: C237281; Tolerance: ±5%; Rated Current: 85mA; DC Resistance: 5.33Ω; RoHS: Yes; ComponentLink1Description: Datasheet; ComponentLink1URL: https://wmsc.lcsc.com/wmsc/upload/file/pdf/v2/lcsc/2304140030_Murata-Electronics-LQW21HN1R5J00L_C237281.pdf; ComponentLink2Description: JLCPCB Part URL; ComponentLink2URL: https://jlcpcb.com/partdetail/C237281; ComponentLink3Description: LCSC Part URL; ComponentLink3URL: https://lcsc.com/product-detail/Inductors-SMD_Murata-Electronics-Murata-Electronics-LQW21HN1R5J00L_C237281.html
footprint IND-0805 (0805 (2012M) Inductor)
pins: 1, 2

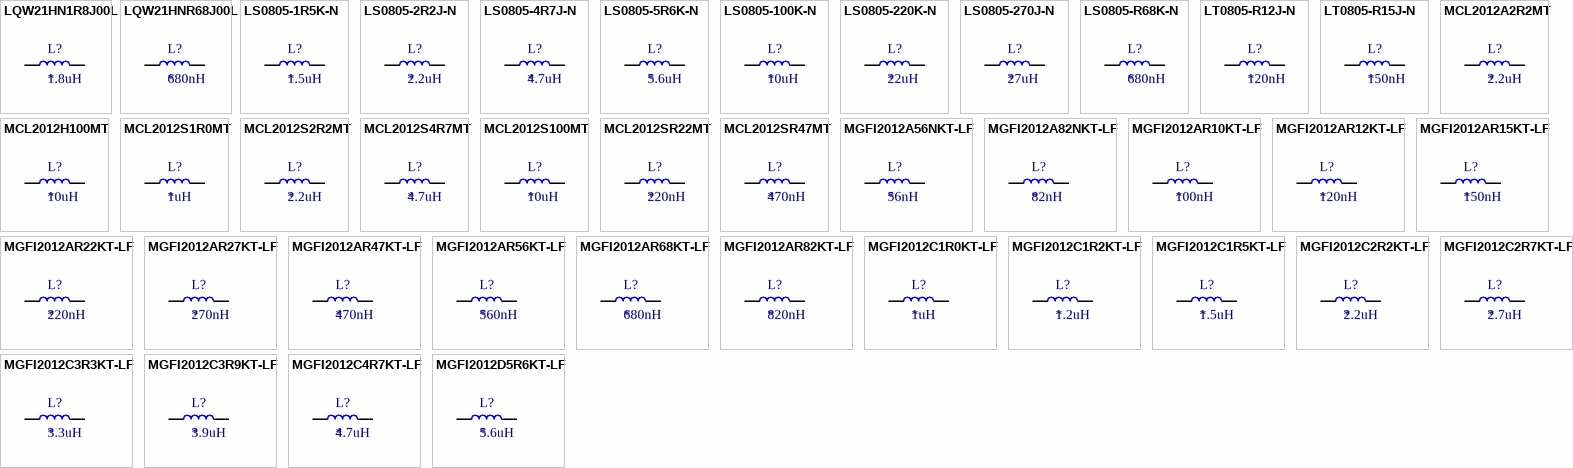
[diagram p13: symbols LQW21HN1R8J00L to MGFI2012D5R6KT-LF]

## LQW21HN1R8J00L
designator L?  Inductance: 1.8uH
Inductor, 1.8uH, ±5%, 5.85Ω, 80mA, SMD 0805; Manufacturer: Murata Electronics; Manufacturer Part Number: LQW21HN1R8J00L; Package Size: 0805; JLCPCB Basic Part: No; JLCPCB Part Number: C703728; Supplier 1: LCSC; Category: Inductors; Supplier Part Number 1: C703728; Tolerance: ±5%; Rated Current: 80mA; DC Resistance: 5.85Ω; RoHS: Yes; ComponentLink1Description: Datasheet; ComponentLink1URL: https://wmsc.lcsc.com/wmsc/upload/file/pdf/v2/lcsc/2304140030_Murata-Electronics-LQW21HN1R8J00L_C703728.pdf; ComponentLink2Description: JLCPCB Part URL; ComponentLink2URL: https://jlcpcb.com/partdetail/C703728; ComponentLink3Description: LCSC Part URL; ComponentLink3URL: https://lcsc.com/product-detail/Power-Inductors_Murata-Electronics-Murata-Electronics-LQW21HN1R8J00L_C703728.html
footprint IND-0805 (0805 (2012M) Inductor)
pins: 1, 2

## LQW21HNR68J00L
designator L?  Inductance: 680nH
Inductor, 680nH, ±5%, 2.21Ω, 130mA, SMD 0805; Manufacturer: Murata Electronics; Manufacturer Part Number: LQW21HNR68J00L; Package Size: 0805; JLCPCB Basic Part: No; JLCPCB Part Number: C341791; Supplier 1: LCSC; Category: Inductors; Supplier Part Number 1: C341791; Tolerance: ±5%; Rated Current: 130mA; DC Resistance: 2.21Ω; RoHS: Yes; ComponentLink1Description: Datasheet; ComponentLink1URL: https://wmsc.lcsc.com/wmsc/upload/file/pdf/v2/lcsc/2304140030_Murata-Electronics-LQW21HNR68J00L_C341791.pdf; ComponentLink2Description: JLCPCB Part URL; ComponentLink2URL: https://jlcpcb.com/partdetail/C341791; ComponentLink3Description: LCSC Part URL; ComponentLink3URL: https://lcsc.com/product-detail/Power-Inductors_Murata-Electronics-Murata-Electronics-LQW21HNR68J00L_C341791.html
footprint IND-0805 (0805 (2012M) Inductor)
pins: 1, 2
